# Altium footprint library thu vien thong.PcbLib: 106 footprints (part 3 of 7)
Each footprint in its own frame and in the unit in brackets; x right, y up, seen from the top. Pads: shape width x height; smd on the part's side, far side on the other; paste and mask are expansions set on the pad; w line width, h text height; cw(c..) or ccw(c..) is an arc to the next point about the centre after c.
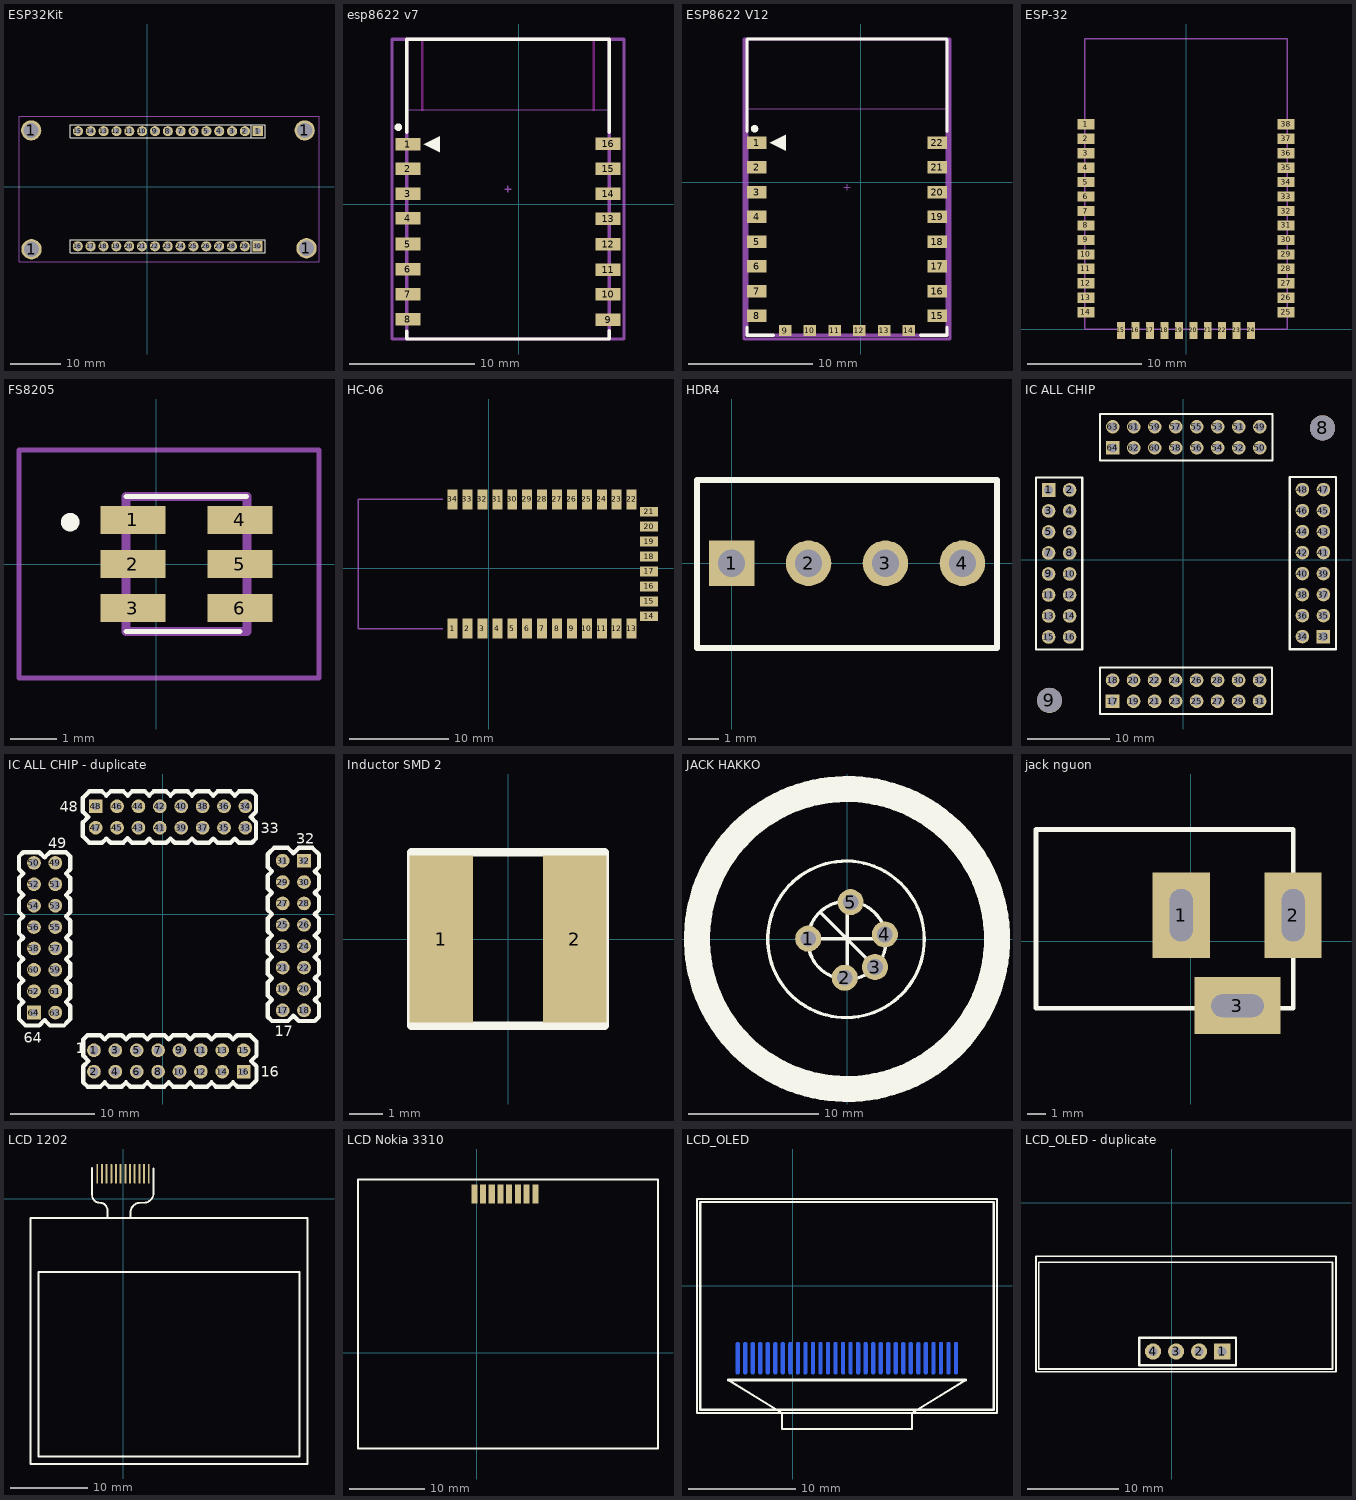
[diagram p2: the footprints below, top view; thin cyan lines are the x and y axes]

## ESP32Kit [mm]
pads (34):
  round 4 hole 3: 1(-22.925,11.125) 1(-22.85,-12.375) 1(31.175,11.125) 1(31.525,-12.175)
  rect 2x2 hole 1.2: 1(21.889,10.972) 30(21.862,-11.79)
  round 2 hole 1.2: 2(19.349,10.972) 3(16.809,10.972) 4(14.269,10.972) 5(11.729,10.972) 6(9.189,10.972) 7(6.649,10.972) 8(4.109,10.972) 9(1.569,10.972) 10(-0.971,10.972) 11(-3.511,10.972) 12(-6.051,10.972) 13(-8.591,10.972) 14(-11.131,10.972) 15(-13.671,10.972) 16(-13.698,-11.79) 17(-11.158,-11.79) 18(-8.618,-11.79) 19(-6.078,-11.79) 20(-3.538,-11.79) 21(-0.998,-11.79) 22(1.542,-11.79) 23(4.082,-11.79) 24(6.622,-11.79) 25(9.162,-11.79) 26(11.702,-11.79) 27(14.242,-11.79) 28(16.782,-11.79) 29(19.322,-11.79)
Top Overlay:
  lines w0.2: -15.222,-13.06 21.227,-13.06 23.386,-13.06 ; -15.222,-10.52 23.386,-10.52 ; -15.218,-13.06 -15.218,-10.52 ; -15.195,9.702 21.254,9.702 23.413,9.702 ; -15.195,12.242 23.413,12.242 ; -15.191,9.702 -15.191,12.242 ; 20.592,-13.06 20.592,-10.52 ; 20.619,9.702 20.619,12.242 ; 23.382,-13.06 23.382,-10.52 ; 23.409,9.702 23.409,12.242
Keep-Out Layer:
  board cut-out: -21.985,-12.249 -21.985,-12.136 -22.029,-11.916 -22.115,-11.708 -22.24,-11.52 -22.399,-11.361 -22.587,-11.236 -22.795,-11.15 -23.015,-11.106 -23.128,-11.106 -23.241,-11.106 -23.461,-11.15 -23.669,-11.236 -23.857,-11.361 -24.016,-11.52 -24.141,-11.708 -24.227,-11.916 -24.271,-12.136 -24.271,-12.249 -24.271,-12.362 -24.227,-12.582 -24.141,-12.79 -24.016,-12.978 -23.857,-13.137 -23.669,-13.262 -23.461,-13.348 -23.241,-13.392 -23.128,-13.392 -23.015,-13.392 -22.795,-13.348 -22.587,-13.262 -22.399,-13.137 -22.24,-12.978 -22.115,-12.79 -22.029,-12.582 -21.985,-12.362
  board cut-out: -21.985,11.351 -21.985,11.463 -22.029,11.684 -22.115,11.892 -22.24,12.08 -22.399,12.239 -22.587,12.364 -22.795,12.45 -23.015,12.494 -23.128,12.494 -23.241,12.494 -23.461,12.45 -23.669,12.364 -23.857,12.239 -24.016,12.08 -24.141,11.892 -24.227,11.684 -24.271,11.463 -24.271,11.351 -24.271,11.238 -24.227,11.017 -24.141,10.809 -24.016,10.622 -23.857,10.463 -23.669,10.338 -23.461,10.252 -23.241,10.208 -23.128,10.208 -23.015,10.208 -22.795,10.252 -22.587,10.338 -22.399,10.463 -22.24,10.622 -22.115,10.809 -22.029,11.017 -21.985,11.238
  board cut-out: 32.415,11.351 32.415,11.463 32.371,11.684 32.285,11.892 32.16,12.08 32.001,12.239 31.813,12.364 31.605,12.45 31.385,12.494 31.272,12.494 31.159,12.494 30.939,12.45 30.731,12.364 30.543,12.239 30.384,12.08 30.259,11.892 30.173,11.684 30.129,11.463 30.129,11.351 30.129,11.238 30.173,11.017 30.259,10.809 30.384,10.622 30.543,10.463 30.731,10.338 30.939,10.252 31.159,10.208 31.272,10.208 31.385,10.208 31.605,10.252 31.813,10.338 32.001,10.463 32.16,10.622 32.285,10.809 32.371,11.017 32.415,11.238
  board cut-out: 32.415,-12.249 32.415,-12.136 32.371,-11.916 32.285,-11.708 32.16,-11.52 32.001,-11.361 31.813,-11.236 31.605,-11.15 31.385,-11.106 31.272,-11.106 31.159,-11.106 30.939,-11.15 30.731,-11.236 30.543,-11.361 30.384,-11.52 30.259,-11.708 30.173,-11.916 30.129,-12.136 30.129,-12.249 30.129,-12.362 30.173,-12.582 30.259,-12.79 30.384,-12.978 30.543,-13.137 30.731,-13.262 30.939,-13.348 31.159,-13.392 31.272,-13.392 31.385,-13.392 31.605,-13.348 31.813,-13.262 32.001,-13.137 32.16,-12.978 32.285,-12.79 32.371,-12.582 32.415,-12.362
Mechanical 2:
  lines w0.127: -25.325,-14.8 34,-14.8 34,13.875 -25.325,13.875 -25.325,-14.8
3D body "61301511821.stp": height 8.51, standoff -3.09, extent -14.714,-13.04 23.386,-10.54
3D body "61301511821.stp": height 8.51, standoff -3.09, extent -14.687,9.722 23.413,12.222

## esp8622 v7 [mm]
pads (16):
  rect 2x1 smd: 1(-8.864,4.792) 2(-8.864,2.822) 3(-8.864,0.822) 4(-8.864,-1.148) 5(-8.864,-3.188) 6(-8.864,-5.198) 7(-8.864,-7.188) 8(-8.864,-9.198) 9(7.136,-9.238) 10(7.136,-7.198) 11(7.136,-5.238) 12(7.136,-3.218) 13(7.136,-1.158) 14(7.136,0.822) 15(7.136,2.842) 16(7.136,4.822)
Top Overlay:
  circle w0.3: c-9.626,6.148 r0.15
  region: -7.594,4.792 -6.324,4.157 -6.324,5.427
  lines w0.254: -8.947,-10.124 -8.947,-10.776 7.22,-10.776 7.22,-10.124 ; -8.947,5.709 -8.947,13.163 7.22,13.163 7.22,5.708
Keep-Out Layer:
  lines w0.203: -7.722,7.544 -7.722,13.189 ; 5.994,7.544 5.994,13.189
Mechanical 13:
  lines w0.051: -8.991,7.52 -8.991,13.174 7.265,13.174 7.265,7.52 -8.991,7.52
  lines w0.254: -8.947,-10.776 7.22,-10.776 7.22,13.163 -8.947,13.163 -8.947,-10.776
  text "CUTOUT POLYGON" at -8.737,12.158 h0.25
  text "ANTENNA AREA" at -8.737,12.666 h0.25
Mechanical 15:
  lines w0.1: -1.118,1.194 -0.61,1.194 ; -0.864,0.94 -0.864,1.448
  lines w0.254: -10.134,-10.776 -10.134,13.163 8.408,13.163 8.408,-10.776 -10.134,-10.776
3D body "ESP_12_E.STEP": height 2.75, standoff 0.04, extent -8.863,-10.699 7.137,13.301

## ESP8622 V12 [mm]
pads (22):
  rect 1.6x1 smd: 1(-8.418,3.211) 2(-8.418,1.211) 3(-8.418,-0.789) 4(-8.418,-2.789) 5(-8.418,-4.789) 6(-8.418,-6.789) 7(-8.418,-8.789) 8(-8.418,-10.789) 15(6.182,-10.789) 16(6.182,-8.789) 17(6.182,-6.789) 18(6.182,-4.789) 19(6.182,-2.789) 20(6.182,-0.789) 21(6.182,1.211) 22(6.182,3.211)
  rect 1x0.9 smd: 9(-6.118,-11.989) 10(-4.118,-11.989) 11(-2.118,-11.989) 12(-0.118,-11.989) 13(1.882,-11.989) 14(3.882,-11.989)
Top Overlay:
  circle w0.3: c-8.593,4.336 r0.15
  region: -7.348,3.211 -6.078,2.576 -6.078,3.846
  lines w0.254: -9.201,-11.705 -9.201,-12.357 -7.049,-12.357 ; -9.201,4.128 -9.201,11.582 6.966,11.582 6.966,4.127 ; 4.814,-12.357 6.966,-12.357 6.966,-11.705
Mechanical 13:
  lines w0.051: -9.245,5.939 -9.245,11.593 7.011,11.593 7.011,5.939 -9.245,5.939
  lines w0.254: -9.201,-12.357 6.966,-12.357 6.966,11.582 -9.201,11.582 -9.201,-12.357
Mechanical 15:
  lines w0.1: -1.372,-0.387 -0.864,-0.387 ; -1.118,-0.641 -1.118,-0.133
  lines w0.254: -9.443,-12.664 -9.443,11.582 7.207,11.582 7.207,-12.664 -9.443,-12.664
3D body "ESP_12_E.STEP": height 2.75, standoff 0.04, extent -9.117,-12.28 6.883,11.72

## ESP-32 [mm] "ESP-32"
pads (38):
  rect 1.5x0.9 smd: 1(-8.8,18.01) 2(-8.8,16.74) 3(-8.8,15.47) 4(-8.8,14.2) 5(-8.8,12.93) 6(-8.8,11.66) 7(-8.8,10.39) 8(-8.8,9.12) 9(-8.8,7.85) 10(-8.8,6.58) 11(-8.8,5.31) 12(-8.8,4.04) 13(-8.8,2.77) 14(-8.8,1.5) 25(8.8,1.5) 26(8.8,2.77) 27(8.8,4.04) 28(8.8,5.31) 29(8.8,6.58) 30(8.8,7.85) 31(8.8,9.12) 32(8.8,10.39) 33(8.8,11.66) 34(8.8,12.93) 35(8.8,14.2) 36(8.8,15.47) 37(8.8,16.74) 38(8.8,18.01)
  rect 0.7x1.5 smd: 15(-5.71,-0.1) 16(-4.44,-0.1) 17(-3.17,-0.1) 18(-1.9,-0.1) 19(-0.63,-0.1) 20(0.64,-0.1) 21(1.91,-0.1) 22(3.18,-0.1) 23(4.45,-0.1) 24(5.72,-0.1)
Mechanical 2:
  lines w0.127: -8.9,0 -8.9,25.5 8.9,25.5 8.9,0 -8.9,0

## FS8205 [mm]
pads (6):
  rect 1.4x0.6 smd: 1(-0.5,0.95) 2(-0.5,0) 3(-0.5,-0.95) 4(1.8,0.95) 5(1.8,0) 6(1.8,-0.95)
Top Overlay:
  lines w0.1: -0.65,-1.45 1.8,-1.45 ; -0.65,1.45 1.95,1.45
  lines w0.2: -1.85,0.8 cw(c-1.85,0.9) -1.85,1 cw(c-1.85,0.9) -1.85,0.8
Mechanical 13:
  lines w0.2: -0.65,-1.45 1.95,-1.45 1.95,1.45 -0.65,1.45 -0.65,-1.45
Mechanical 15:
  lines w0.1: -2.95,-2.45 3.5,-2.45 3.5,2.45 -2.95,2.45 -2.95,-2.45
3D body "FS8205.stp": height 1.46, standoff 0.01, extent -0.79,-1.45 2.01,1.45

## HC-06 [mm]
pads (34):
  rect 1x2 smd: 1(-3.633,-6.071) 2(-2.133,-6.071) 3(-0.633,-6.071) 4(0.867,-6.071) 5(2.367,-6.071) 6(3.867,-6.071) 7(5.367,-6.071) 8(6.867,-6.071) 9(8.367,-6.071) 10(9.867,-6.071) 11(11.367,-6.071) 12(12.867,-6.071) 13(14.367,-6.071) 22(14.367,6.929) 23(12.867,6.929) 24(11.367,6.929) 25(9.867,6.929) 26(8.367,6.929) 27(6.867,6.929) 28(5.367,6.929) 29(3.867,6.929) 30(2.367,6.929) 31(0.867,6.929) 32(-0.633,6.929) 33(-2.133,6.929) 34(-3.633,6.929)
  rect 1.8x1 smd: 14(16.117,-4.821) 15(16.117,-3.321) 16(16.117,-1.821) 17(16.117,-0.321) 18(16.117,1.179) 19(16.117,2.679) 20(16.117,4.179) 21(16.117,5.679)
Mechanical 2:
  lines w0.127: -4.633,-6.071 -13.133,-6.071 -13.133,6.929 -4.633,6.929

## HDR4 [mm] "Connector; Header; 4 Position"
pads (4):
  rect 1.5x1.5 hole 0.9: 1(0,0)
  round 1.5 hole 0.9: 2(2.54,0) 3(5.08,0) 4(7.62,0)
Top Overlay:
  lines w0.2: -1.143,-2.794 -1.143,2.743 8.763,2.743 8.763,-2.794 -1.143,-2.794
3D body "h4.stp": height 11.72, standoff -3.54, extent -1.27,-2.92 8.89,2.88

## IC ALL CHIP [mil]
pads (66):
  rect 65x65 hole 43: 1(-641.97,333.43) 17(-337.36,-672.48) 33(666.57,-364.92) 64(-336.38,534.21)
  round 65 hole 43: 2(-541.97,333.43) 3(-641.97,233.43) 4(-541.97,233.43) 5(-641.97,133.43) 6(-541.97,133.43) 7(-641.97,33.43) 8(-541.97,33.43) 9(-641.97,-66.57) 10(-541.97,-66.57) 11(-641.97,-166.57) 12(-541.97,-166.57) 13(-641.97,-266.57) 14(-541.97,-266.57) 15(-641.97,-366.57) 16(-541.97,-366.57) 18(-337.36,-572.48) 19(-237.36,-672.48) 20(-237.36,-572.48) 21(-137.36,-672.48) 22(-137.36,-572.48) 23(-37.36,-672.48) 24(-37.36,-572.48) 25(62.64,-672.48) 26(62.64,-572.48) 27(162.64,-672.48) 28(162.64,-572.48) 29(262.64,-672.48) 30(262.64,-572.48) 31(362.64,-672.48) 32(362.64,-572.48) 34(566.57,-364.92) 35(666.57,-264.92) 36(566.57,-264.92) 37(666.57,-164.92) 38(566.57,-164.92) 39(666.57,-64.92) 40(566.57,-64.92) 41(666.57,35.08) 42(566.57,35.08) 43(666.57,135.08) 44(566.57,135.08) 45(666.57,235.08) 46(566.57,235.08) 47(666.57,335.08) 48(566.57,335.08) 49(363.62,634.21) 50(363.62,534.21) 51(263.62,634.21) 52(263.62,534.21) 53(163.62,634.21) 54(163.62,534.21) 55(63.62,634.21) 56(63.62,534.21) 57(-36.38,634.21) 58(-36.38,534.21) 59(-136.38,634.21) 60(-136.38,534.21) 61(-236.38,634.21) 62(-236.38,534.21) 63(-336.38,634.21)
  round 120 hole 118: 8(662.4,628.94) 9(-637.8,-668.31)
Top Overlay:
  lines w10: -701.97,-426.57 -701.97,393.43 -481.97,393.43 -481.97,-426.57 -701.97,-426.57 ; -397.36,-732.48 -397.36,-512.48 422.64,-512.48 422.64,-732.48 -397.36,-732.48 ; -396.38,474.21 -396.38,694.21 423.62,694.21 423.62,474.21 -396.38,474.21 ; 506.57,-424.92 506.57,395.08 726.57,395.08 726.57,-424.92 506.57,-424.92
3D body "Samtec-TSW-108-07-G-D.step": height 83, standoff -347, extent -386.37,484.22 413.63,684.22
3D body "Samtec-TSW-108-07-G-D.step": height 83, standoff -347, extent 516.57,-414.91 716.57,385.09
3D body "Samtec-TSW-108-07-G-D.step": height 83, standoff -347, extent -387.36,-722.47 412.64,-522.47
3D body "Samtec-TSW-108-07-G-D.step": height 83, standoff -347, extent -691.96,-416.58 -491.96,383.42

## IC ALL CHIP - duplicate [mil]
pads (64):
  round 64 / inner round 60 / far side round 64 hole 43.3 mask+10: 1(-320.65,-635.56) 2(-320.65,-735.56) 3(-220.65,-635.56) 4(-220.65,-735.56) 5(-120.65,-635.56) 6(-120.65,-735.56) 7(-20.65,-635.56) 8(-20.65,-735.56) 9(79.35,-635.56) 10(79.35,-735.56) 11(179.35,-635.56) 17(561.78,-448.9) 18(661.78,-448.9) 19(561.78,-348.9) 20(661.78,-348.9) 21(561.78,-248.9) 22(661.78,-248.9) 23(561.78,-148.9) 24(661.78,-148.9) 25(561.78,-48.9) 26(661.78,-48.9) 33(387.45,405.17) 34(387.45,505.17) 35(287.45,405.17) 36(287.45,505.17) 37(187.45,405.17) 38(187.45,505.17) 39(87.45,405.17) 40(87.45,505.17) 41(-12.55,405.17) 42(-12.55,505.17) 43(-112.55,405.17) 50(-601.15,240.7) 51(-501.15,140.7) 52(-601.15,140.7) 53(-501.15,40.7) 54(-601.15,40.7) 55(-501.15,-59.3) 56(-601.15,-59.3) 57(-501.15,-159.3) 58(-601.15,-159.3) 59(-501.15,-259.3)
  round 64 / inner round 60 / far side round 64 hole 35.43 mask+10: 12(179.35,-735.56) 13(279.35,-635.56) 14(279.35,-735.56) 15(379.35,-635.56) 27(561.78,51.1) 28(661.78,51.1) 29(561.78,151.1) 30(661.78,151.1) 31(561.78,251.1) 44(-112.55,505.17) 45(-212.55,405.17) 46(-212.55,505.17) 47(-312.55,405.17) 49(-501.15,240.7) 60(-601.15,-259.3) 61(-501.15,-359.3) 62(-601.15,-359.3) 63(-501.15,-459.3)
  rect 64x64 hole 35.43 mask+10: 16(379.35,-735.56) 32(661.78,251.1) 48(-312.55,505.17) 64(-601.15,-459.3)
Top Layer:
  lines w8: -501.15,-59.3 -483.05,-41.2
Top Overlay:
  drawing of 300 lines, arcs and shapes, not listed
  text "64" at -649.92,-600.2 h50
  text "49" at -534.92,309.8 h50
  text "16" at 460.08,-760.2 h50
  text "1" at -404.92,-650.2 h50
  text "32" at 625.08,329.8 h50
  text "17" at 525.08,-570.2 h50
  text "33" at 460.08,379.8 h50
  text "48" at -479.92,479.8 h50

## Inductor SMD 2 [mm]
pads (2):
  rect 1.9x5 smd: 1(-2,0) 2(2,0)
Top Overlay:
  lines w0.254: -2.9,-2.6 2.9,-2.6 2.9,2.6 -2.9,2.6 -2.9,-2.6
3D body "User Library-sdr0503_stp.STEP": height 3, standoff 0, extent -2.4,-2.4 2.6,2.6

## JACK HAKKO [mm]
pads (5):
  round 2 hole 1.2: 1(-2.975,0.025) 2(-0.175,-2.975) 3(2.15,-2.15) 4(2.9,0.35) 5(0.275,2.825)
Top Overlay:
  circle w0.254: c0,-0.1 r3
  circle w2: c0,0 r11.5
  circle w0.254: c-0.075,-0.025 r6
  lines w0.254: -2.975,0.025 2.925,0.025 ; -2.05,2.05 0.025,-0.025 ; 0.025,-3.05 0.025,2.85 ; 0.025,0 0.025,0.025 0.025,-0.025 ; 2.15,-2.15 0.025,-0.025

## jack nguon [mil]
pads (3):
  rect 120x180 hole 48 slot 110 at 90 deg: 1(-20,55) 2(215,55)
  rect 180x120 hole 48 slot 110 at 0 deg: 3(98,-135)
Top Overlay:
  lines w10: -325,-140.2 215,-140.2 215,235 -325,235 -325,-140.2
3D body "User Library-DC_JACK.STEP": height 433.07, standoff -157.48, extent -325.43,-153.66 245.43,232.16

## LCD 1202 [mil]
pads (12):
  rrect50% 10x100 smd: 1(-134,127) 2(-110,127) 3(-86,127) 4(-62,127) 5(-38,127) 6(-14,127) 7(10,127) 8(34,127) 9(58,127) 10(82,127) 11(106,127) 12(130,127)
Top Overlay:
  lines w10: -160.04,156.8 -160.04,17.95 ccw(c-120.67,17.95) -120.67,-21.42 cw(c-120.67,-60.79) -81.3,-60.79 -81.3,-100.16 ; 36.81,-100.16 36.81,-71.42 cw(c86.81,-71.42) 86.81,-21.42 104.92,-21.42 ccw(c104.92,28.58) 154.92,28.58 154.92,155.27 ; -475,-1360 -475,-100.16 942.32,-100.16 942.32,-1360 -475,-1360 ; -435.63,-1320.63 -435.63,-375.75 902.95,-375.75 902.95,-1320.63 -435.63,-1320.63

## LCD Nokia 3310 [mm]
pads (8):
  rect 0.8x2.54 smd: 1(-0.342,20.955) 2(0.808,20.955) 3(1.958,20.955) 4(3.108,20.955) 5(4.258,20.955) 6(5.408,20.955) 7(6.558,20.955) 8(7.708,20.955)
Top Overlay:
  lines w0.254: -15.708,-12.669 23.916,-12.669 23.916,22.891 -15.708,22.891 -15.708,-12.669

## LCD_OLED [mm]
pads (30):
  oval 0.35x3 smd far side: 1(-5.136,-6.731) 2(-4.436,-6.731) 3(-3.736,-6.731) 4(-3.036,-6.731) 5(-2.336,-6.731) 6(-1.636,-6.731) 7(-0.936,-6.731) 8(-0.236,-6.731) 9(0.464,-6.731) 10(1.164,-6.731) 11(1.864,-6.731) 12(2.564,-6.731) 13(3.264,-6.731) 14(3.964,-6.731) 15(4.664,-6.731) 16(5.364,-6.731) 17(6.064,-6.731) 18(6.764,-6.731) 19(7.464,-6.731) 20(8.164,-6.731) 21(8.864,-6.731) 22(9.564,-6.731) 23(10.264,-6.731) 24(10.964,-6.731) 25(11.664,-6.731) 26(12.364,-6.731) 27(13.064,-6.731) 28(13.764,-6.731) 29(14.464,-6.731) 30(15.164,-6.731)
Top Overlay:
  lines w0.2: -6.025,-8.763 -1.02,-11.825 ; 16.075,-8.763 11.079,-11.825 ; -1.02,-11.825 -1.02,-13.325 11.08,-13.325 11.08,-11.825 -1.02,-11.825 ; 11.079,-11.825 -5.02,-11.825 -6.02,-11.825 -8.92,-11.825 -8.92,8.075 18.98,8.075 18.98,-11.825 16.08,-11.825 11.079,-11.825 ; -8.62,-11.525 18.68,-11.525 18.68,7.775 -8.62,7.775 -8.62,-11.525
  lines w0.254: -6.025,-8.763 16.073,-8.763
Bottom Overlay:
  lines w0.2: -6.025,-8.763 -1.02,-11.825 11.08,-11.825 ; 11.079,-11.825 16.075,-8.763
  lines w0.254: -5.263,-8.509 -5.009,-8.509 ; -5.263,-4.953 -5.009,-4.953 ; -6.025,-8.763 -6.025,-4.699 16.073,-4.699 16.073,-8.763 -6.025,-8.763
  text "OLED_30Pin_FPC" at -5.42,-3.825 h0.51

## LCD_OLED - duplicate [mil]
pads (4):
  rect 70x70 hole 39.37: 1(219.02,-645.94)
  round 70 hole 39.37: 2(119.02,-645.94) 3(19.02,-645.94) 4(-80.98,-645.94)
Top Overlay:
  lines w7.87: -277.44,-733.5 198.94,-733.5 -277.44,-733.5 ; -277.44,-733.5 -277.44,-733.5 ; -588.46,-733.5 -588.46,-233.27 712.52,-233.27 712.52,-733.5 395.79,-733.5 198.89,-733.5 -434.92,-733.5 -474.29,-733.5 -588.46,-733.5 ; -576.65,-721.69 696.77,-721.69 696.77,-258.86 -576.65,-258.86 -576.65,-721.69
  lines w10: -140.98,-705.94 279.02,-705.94 279.02,-585.94 -140.98,-585.94 -140.98,-705.94
Bottom Overlay:
  lines w7.87: -277.44,-733.5 198.94,-733.5
3D body "Samtec-TSW-104-07-G-S.step": height 330, standoff -100, extent -130.99,-695.95 269.01,-595.95